# Altium schematic symbol library IC_TI.SCHLIB: 1162 symbols (part 3 of 8) (continued)
## LM5109BMA_NOPB
designator U?
Integrated Circuit; Manufacturer_Name: Texas Instruments; Manufacturer_Part_Number: LM5109BMA/NOPB; Datasheet Link: http://docs-emea.rs-online.com/webdocs/0b59/0900766b80b592e1.pdf; Height: 1.753mm; Mouser Part Number: 926-LM5109BMA/NOPB; Mouser Price/Stock: https://www.mouser.com/Search/Refine.aspx?Keyword=926-LM5109BMA%2FNOPB; RS Part Number: 0517270; RS Price/Stock: http://uk.rs-online.com/web/p/products/0517270
footprint SOIC8_1.27 (SOP, 8-Leads, Pitch 1.27mm)
pins: 1 VDD (power), 2 HI, 3 LI, 4 VSS (power), 5 LO, 6 HS, 7 HO, 8 HB

## LM7321MA
designator U?
Integrated Circuit; Manufacturer_Name: Texas Instruments; Manufacturer_Part_Number: LM7321MA; Datasheet Link: https://componentsearchengine.com/Datasheets/2/LM7321MA.pdf; Height: 1.75mm
footprint SOIC8_1.27 (SOP, 8-Leads, Pitch 1.27mm)
pins: 1 N/C_1, 2 -IN (in), 3 +IN (in), 4 V- (power), 5 N/C_2, 6 OUT (out), 7 V+, 8 N/C_3

## LM7321MF_NOPB
designator U?
Integrated Circuit; Manufacturer_Name: Texas Instruments; Manufacturer_Part_Number: LM7321MF/NOPB; Datasheet Link: http://www.ti.com/lit/gpn/lm7321; Height: 1.45mm; Mouser Part Number: 926-LM7321MF/NOPB; Mouser Price/Stock: https://www.mouser.com/Search/Refine.aspx?Keyword=926-LM7321MF%2FNOPB; RS Part Number: 1627716; RS Price/Stock: http://uk.rs-online.com/web/p/products/1627716
footprint SOT23-5 (SOT23, 5-Leads, Body 3.0x3.0mm (max), Pitch 0.95mm, IPC Medium Density)
pins: 1 OUT, 2 V-, 3 +IN, 4 -IN, 5 V+

## LM8261M5_NOPB
designator U?
Integrated Circuit; Manufacturer_Name: Texas Instruments; Manufacturer_Part_Number: LM8261M5/NOPB; Datasheet Link: http://www.ti.com/lit/ds/symlink/lm8261.pdf; Height: 1.45mm; Mouser Part Number: 926-LM8261M5/NOPB; Mouser Price/Stock: https://www.mouser.com/Search/Refine.aspx?Keyword=926-LM8261M5%2FNOPB; RS Part Number: 5343936P; RS Price/Stock: http://uk.rs-online.com/web/p/products/5343936P
footprint SOT23-5 (SOT23, 5-Leads, Body 3.0x3.0mm (max), Pitch 0.95mm, IPC Medium Density)
pins: 1 OUT (out), 2 V-, 3 +IN (in), 4 -IN (in), 5 V+

## LM22670MR-5.0_NOPB
designator U??
Undefined or Miscellaneous; Manufacturer_Name: Texas Instruments; Manufacturer_Part_Number: LM22670MR-5.0/NOPB; Datasheet Link: http://www.farnell.com/datasheets/2060263.pdf; Height: 1.68mm; Mouser Part Number: 926-LM22670MR50NOPB; Mouser Price/Stock: https://www.mouser.com/Search/Refine.aspx?Keyword=926-LM22670MR50NOPB; RS Part Number: 7614845P; RS Price/Stock: http://uk.rs-online.com/web/p/products/7614845P
footprint SOIC8_1.27-PAD
pins: 1 BOOT, 2 NC, 3 RT/SYNC, 4 FB, 5 EN, 6 GND, 7 VIN, 8 SW, 9 EP

## LM22676MR-5.0_NOPB
designator U?
Integrated Circuit; Manufacturer_Name: Texas Instruments; Manufacturer_Part_Number: LM22676MR-5.0/NOPB; Datasheet Link: http://www.ti.com/lit/gpn/lm22676; Height: 1.68mm; Mouser Part Number: 926-LM22676MR5.0NOPB; Mouser Price/Stock: https://www.mouser.com/Search/Refine.aspx?Keyword=926-LM22676MR5.0NOPB; RS Part Number: 7614870; RS Price/Stock: http://uk.rs-online.com/web/p/products/7614870
footprint SOIC8_1.27-PAD
pins: 1 BOOT, 2 NC_1, 3 NC_2, 4 FB, 5 EN, 6 GND, 7 VIN, 8 SW, 9 EP

## LM27313XMFX_NOPB
designator U?
Integrated Circuit; Manufacturer_Name: Texas Instruments; Manufacturer_Part_Number: LM27313XMFX/NOPB; Datasheet Link: http://www.ti.com/lit/ds/symlink/lm27313.pdf; Height: 1.45mm; Mouser Part Number: 926-LM27313XMFX/NOPB; Mouser Price/Stock: https://www.mouser.com/Search/Refine.aspx?Keyword=926-LM27313XMFX%2FNOPB
footprint SOT23-5 (SOT23, 5-Leads, Body 3.0x3.0mm (max), Pitch 0.95mm, IPC Medium Density)
pins: 1 SW, 2 GND, 3 FB, 4 ~{SHDN}, 5 VIN

## LM94022BIMG_NOPB
designator U?
Integrated Circuit; Manufacturer_Name: Texas Instruments; Manufacturer_Part_Number: LM94022BIMG/NOPB; Datasheet Link: http://www.ti.com/lit/ds/symlink/lm94022.pdf; Height: 1.1mm; Mouser Part Number: 926-LM94022BIMG/NOPB; Mouser Price/Stock: https://www.mouser.com/Search/Refine.aspx?Keyword=926-LM94022BIMG%2FNOPB; RS Part Number: 6394014P; RS Price/Stock: http://uk.rs-online.com/web/p/products/6394014P
footprint SOT353
pins: 1 GS0, 2 GND (power), 3 OUT (out), 4 VDD (power), 5 GS1

## LMC555CM_NOPB
designator U?
Integrated Circuit; Manufacturer_Name: Texas Instruments; Manufacturer_Part_Number: LMC555CM/NOPB; Datasheet Link: http://www.ti.com/lit/ds/symlink/lmc555.pdf; Height: 1.75mm; Mouser Part Number: 926-LMC555CM/NOPB; Mouser Price/Stock: https://www.mouser.com/Search/Refine.aspx?Keyword=926-LMC555CM%2FNOPB; RS Part Number: 5343992P; RS Price/Stock: http://uk.rs-online.com/web/p/products/5343992P
footprint SOIC8_1.27 (SOP, 8-Leads, Pitch 1.27mm)
pins: 1 GND (power), 2 ~{TRIGGER}, 3 OUTPUT (out), 4 ~{RESET}, 5 CONTROL_VOLTAGE, 6 THRESHOLD, 7 DISCHARGE, 8 V+

## LMC555CMM_NOPB
designator U?
Integrated Circuit; Manufacturer_Name: Texas Instruments; Manufacturer_Part_Number: LMC555CMM/NOPB; Datasheet Link: http://www.ti.com/lit/gpn/lmc555; Height: 1.1mm; Mouser Part Number: 926-LMC555CMM/NOPB; Mouser Price/Stock: https://www.mouser.com/Search/Refine.aspx?Keyword=926-LMC555CMM%2FNOPB; RS Part Number: 9222158; RS Price/Stock: http://uk.rs-online.com/web/p/products/9222158
footprint VSSOP8_0.65-PAD
pins: 1 GND, 2 ~{TRIGGER}, 3 OUTPUT, 4 ~{RESET}, 5 CONTROL_VOLTAGE, 6 THRESHOLD, 7 DISCHARGE, 8 V+

## LMC555CN_NOPB
designator U?
Integrated Circuit; Manufacturer_Name: Texas Instruments; Manufacturer_Part_Number: LMC555CN/NOPB; Datasheet Link: http://www.ti.com/lit/ml/mpdi001b/mpdi001b.pdf; Height: 5.08mm; Mouser Part Number: 926-LMC555CN/NOPB; Mouser Price/Stock: https://www.mouser.com/Search/Refine.aspx?Keyword=926-LMC555CN%2FNOPB; RS Part Number: 5344002P; RS Price/Stock: http://uk.rs-online.com/web/p/products/5344002P
footprint DIP8-A
pins: 1 GROUND, 2 ~{TRIGGER}, 3 OUTPUT (out), 4 ~{RESET}, 5 CONTROL_VOLTAGE, 6 THRESHOLD, 7 DISCHARGE, 8 V+

## LMC6482IM_NOPB
designator U?
Integrated Circuit; Manufacturer_Name: Texas Instruments; Manufacturer_Part_Number: LMC6482IM/NOPB; Datasheet Link: http://docs-emea.rs-online.com/webdocs/06f0/0900766b806f008d.pdf; Height: 1.75mm; Mouser Part Number: 926-LMC6482IM/NOPB; Mouser Price/Stock: https://www.mouser.com/Search/Refine.aspx?Keyword=926-LMC6482IM%2FNOPB; RS Part Number: 5360199P; RS Price/Stock: http://uk.rs-online.com/web/p/products/5360199P
footprint SOIC8_1.27 (SOP, 8-Leads, Pitch 1.27mm)
pins: 1 OUTPUT_A (out), 2 INPUTA- (in), 3 INPUTA+ (in), 4 V-, 5 INPUTB+ (in), 6 INPUTB- (in), 7 OUTPUT_B (out), 8 V+

## LMC6484AIM
designator U?
Integrated Circuit; Manufacturer_Name: Texas Instruments; Manufacturer_Part_Number: LMC6484AIM; Datasheet Link: http://www.ti.com/lit/ds/symlink/lmc6484.pdf; Height: 1.753mm; Mouser Part Number: 926-LMC6484AIM; Mouser Price/Stock: https://www.mouser.com/Search/Refine.aspx?Keyword=926-LMC6484AIM; RS Part Number: 4714949; RS Price/Stock: http://uk.rs-online.com/web/p/products/4714949
footprint SOIC14_1.27
pins: 1 1OUT (out), 2 1INPUT- (in), 3 1INPUT+ (in), 4 V+, 5 2INPUT+ (in), 6 2INPUT- (in), 7 2OUT (out), 8 3OUT (out), 9 3INPUT- (in), 10 3INPUT+ (in), 11 V-/GND (power), 12 4INPUT+ (in), 13 4INPUT- (in), 14 4OUT (out)

## LMC6484AIN
designator U?
Integrated Circuit; Manufacturer_Name: Texas Instruments; Manufacturer_Part_Number: LMC6484AIN; Mouser Part Number: 926-LMC6484AIN; Mouser Price/Stock: https://www.mouser.com/Search/Refine.aspx?Keyword=926-LMC6484AIN; RS Part Number: 4714955; RS Price/Stock: http://uk.rs-online.com/web/p/products/4714955
footprint DIP14
pins: 1 OUT_1, 2 NEG_1, 3 POS_1, 4 V+, 5 POS_2, 6 NEG_2, 7 OUT_2, 8 OUT_3, 9 NEG_3, 10 POS_3, 11 V-, 12 POS_4, 13 NEG_4, 14 OUT_4

## LMC7660IM_NOPB
designator U?
Integrated Circuit; Manufacturer_Name: Texas Instruments; Manufacturer_Part_Number: LMC7660IM/NOPB; Datasheet Link: http://www.ti.com/lit/ds/symlink/lmc7660.pdf; Height: 1.75mm; Mouser Part Number: 926-LMC7660IM/NOPB; Mouser Price/Stock: https://www.mouser.com/Search/Refine.aspx?Keyword=926-LMC7660IM%2FNOPB; RS Part Number: 5360212P; RS Price/Stock: http://uk.rs-online.com/web/p/products/5360212P
footprint SOIC8_1.27 (SOP, 8-Leads, Pitch 1.27mm)
pins: 1 NC, 2 CAP+, 3 GND (power), 4 CAP-, 5 VOUT (out), 6 LV, 7 OSC, 8 V+

## LMC7660IN_NOPB
designator U?
Integrated Circuit; Manufacturer_Name: Texas Instruments; Manufacturer_Part_Number: LMC7660IN/NOPB; Datasheet Link: http://www.ti.com/lit/gpn/lmc7660; Height: 5.08mm; Mouser Part Number: 926-LMC7660IN/NOPB; Mouser Price/Stock: https://www.mouser.com/Search/Refine.aspx?Keyword=926-LMC7660IN%2FNOPB; RS Part Number: 0460544P; RS Price/Stock: http://uk.rs-online.com/web/p/products/0460544P
footprint DIP8-A
pins: 1 N/C, 2 CAP+, 3 GND, 4 CAP-, 5 VOUT, 6 LV, 7 OSC, 8 V+

## LME49720MA
designator U?
Integrated Circuit; Manufacturer_Name: Texas Instruments; Manufacturer_Part_Number: LME49720MA; Datasheet Link: http://www.ti.com/lit/ds/symlink/lme49720.pdf; Height: 1.75mm
footprint SOIC8_1.27 (SOP, 8-Leads, Pitch 1.27mm)
pins: 1 OUTPUT_A (out), 2 INVERTING_INPUT_A (in), 3 NON-INVERTING_INPUT_A (in), 4 V-, 5 NON-INVERTING_INPUT_B (in), 6 INVERTING_INPUT_B (in), 7 OUTPUT_B (out), 8 V+

## LME49720NA_NOPB
designator U?
Integrated Circuit; Manufacturer_Name: Texas Instruments; Manufacturer_Part_Number: LME49720NA/NOPB; Datasheet Link: http://www.ti.com/lit/ds/symlink/lme49720.pdf; Height: 5.08mm; Mouser Part Number: 926-LME49720NA/NOPB; Mouser Price/Stock: https://www.mouser.com/Search/Refine.aspx?Keyword=926-LME49720NA%2FNOPB; RS Part Number: 7616217P; RS Price/Stock: http://uk.rs-online.com/web/p/products/7616217P
footprint DIP8-A
pins: 1 OUTPUT_A, 2 INPUTA_-, 3 INPUTA_+, 4 V-, 5 INPUT_B+, 6 INPUT_B-, 7 OUTPUT_B, 8 V+

## LMR14020SDDA
designator U?
Integrated Circuit; Manufacturer_Name: Texas Instruments; Manufacturer_Part_Number: LMR14020SDDA; Datasheet Link: http://www.ti.com/lit/ds/symlink/lmr14020.pdf; Height: 1.7mm; Mouser Part Number: 595-LMR14020SDDA; Mouser Price/Stock: https://www.mouser.com/Search/Refine.aspx?Keyword=595-LMR14020SDDA; RS Part Number: 1629813; RS Price/Stock: http://uk.rs-online.com/web/p/products/1629813
footprint SOIC8_1.27-PAD
pins: 1 BOOT, 2 VIN (in), 3 EN, 4 RT/SYNC, 5 FB, 6 SS, 7 GND (power), 8 SW, 9 EP (power)

## LMR14020SDDAR
designator U?
Integrated Circuit; Manufacturer_Name: Texas Instruments; Manufacturer_Part_Number: LMR14020SDDAR; Datasheet Link: http://www.ti.com/lit/gpn/lmr14020; Height: 1.7mm; Mouser Part Number: 595-LMR14020SDDAR; Mouser Price/Stock: https://www.mouser.com/Search/Refine.aspx?Keyword=595-LMR14020SDDAR
footprint SOIC8_1.27 (SOP, 8-Leads, Pitch 1.27mm)
pins: 1 BOOT, 2 VIN, 3 EN, 4 RT/SYNC, 5 FB, 6 SS, 7 GND, 8 SW

## LMR14030SDDA
designator U?
Integrated Circuit; Manufacturer_Name: Texas Instruments; Manufacturer_Part_Number: LMR14030SDDA; Datasheet Link: http://www.ti.com/lit/ds/symlink/lmr14030.pdf; Height: 1.7mm; Mouser Part Number: 595-LMR14030SDDA; Mouser Price/Stock: https://www.mouser.com/Search/Refine.aspx?Keyword=595-LMR14030SDDA; RS Part Number: 1456281; RS Price/Stock: http://uk.rs-online.com/web/p/products/1456281
footprint SOIC8_1.27-PAD
pins: 1 BOOT, 2 VIN (in), 3 EN, 4 RT/SYNC, 5 FB, 6 SS, 7 GND (power), 8 SW, 9 EP

## LMR16010PDDAR
designator U?
Integrated Circuit; Manufacturer_Name: Texas Instruments; Manufacturer_Part_Number: LMR16010PDDAR; Datasheet Link: http://www.ti.com/lit/ds/symlink/lmr16010.pdf; Height: 1.7mm; Mouser Part Number: 595-LMR16010PDDAR; Mouser Price/Stock: https://www.mouser.com/Search/Refine.aspx?Keyword=595-LMR16010PDDAR
footprint SOIC8_1.27-PAD
pins: 1 BOOT, 2 VIN, 3 EN, 4 RT/SYNC, 5 FB, 6 PGOOD, 7 GND, 8 SW, 9 EP

## LMR16020PDDAR
designator U?
Integrated Circuit; Manufacturer_Name: Texas Instruments; Manufacturer_Part_Number: LMR16020PDDAR; Datasheet Link: http://www.ti.com/lit/gpn/lmr16020; Height: 1.7mm; Mouser Part Number: 595-LMR16020PDDAR; Mouser Price/Stock: https://www.mouser.com/Search/Refine.aspx?Keyword=595-LMR16020PDDAR
footprint SOIC8_1.27-PAD
pins: 1 BOOT, 2 VIN, 3 EN, 4 RT/SYNC, 5 FB, 6 PGOOD, 7 GND, 8 SW, 9 EP

## LMR16030SDDAR
designator U?
Integrated Circuit; Manufacturer_Name: Texas Instruments; Manufacturer_Part_Number: LMR16030SDDAR; Datasheet Link: http://www.ti.com/lit/gpn/lmr16030; Height: 1.7mm; Mouser Part Number: 595-LMR16030SDDAR; Mouser Price/Stock: https://www.mouser.com/Search/Refine.aspx?Keyword=595-LMR16030SDDAR
footprint SOIC8_1.27-PAD
pins: 1 BOOT, 2 VIN, 3 EN, 4 RT/SYNC, 5 FB, 6 SS, 7 GND, 8 SW, 9 EP

## LMV321IDBVR
designator U?
Integrated Circuit; Manufacturer_Name: Texas Instruments; Manufacturer_Part_Number: LMV321IDBVR; Datasheet Link: http://www.ti.com/lit/gpn/lmv321; Mouser Part Number: 595-LMV321IDBVR; Mouser Price/Stock: https://www.mouser.com/Search/Refine.aspx?Keyword=595-LMV321IDBVR
footprint SOT23-5 (SOT23, 5-Leads, Body 3.0x3.0mm (max), Pitch 0.95mm, IPC Medium Density)
pins: 1 1IN+, 2 GND, 3 1IN-, 4 OUT, 5 VCC+

## LMV321M5_NOPB
designator U?
Integrated Circuit; Manufacturer_Name: Texas Instruments; Manufacturer_Part_Number: LMV321M5/NOPB; Datasheet Link: http://www.ti.com/lit/ds/symlink/lmv321-n.pdf; Height: 1.45mm; Mouser Part Number: 926-LMV321M5/NOPB; Mouser Price/Stock: https://www.mouser.com/Search/Refine.aspx?Keyword=926-LMV321M5%2FNOPB; RS Part Number: 5338366P; RS Price/Stock: http://uk.rs-online.com/web/p/products/5338366P
footprint SOT23-5 (SOT23, 5-Leads, Body 3.0x3.0mm (max), Pitch 0.95mm, IPC Medium Density)
pins: 1 +IN (in), 2 V-, 3 -IN (in), 4 OUTPUT (out), 5 V+

## LMV324DTBR2G
designator U?
Integrated Circuit; Manufacturer_Name: ON Semiconductor; Manufacturer_Part_Number: LMV324DTBR2G; Datasheet Link: https://www.onsemi.com/pub/Collateral/LMV321-LMV358-LMV324-D.PDF; Height: 1.2mm; Mouser Part Number: 863-LMV324DTBR2G; Mouser Price/Stock: https://www.mouser.com/Search/Refine.aspx?Keyword=863-LMV324DTBR2G; RS Part Number: 1629358; RS Price/Stock: http://uk.rs-online.com/web/p/products/1629358
footprint TSSOP14_0.65 (TSOP, 14-Leads, Body 5.00x4.40mm, Pitch 0.65mm, Thermal Pad 2.31x2.46mm, IPC Low Density)
pins: 1 OUTA (out), 2 INA- (in), 3 INA+ (in), 4 VCC (power), 5 INB+ (in), 6 INB- (in), 7 OUTB (out), 8 OUTC (out), 9 INC- (in), 10 INC+ (in), 11 VEE (power), 12 IND+ (in), 13 IND- (in), 14 OUTD (out)

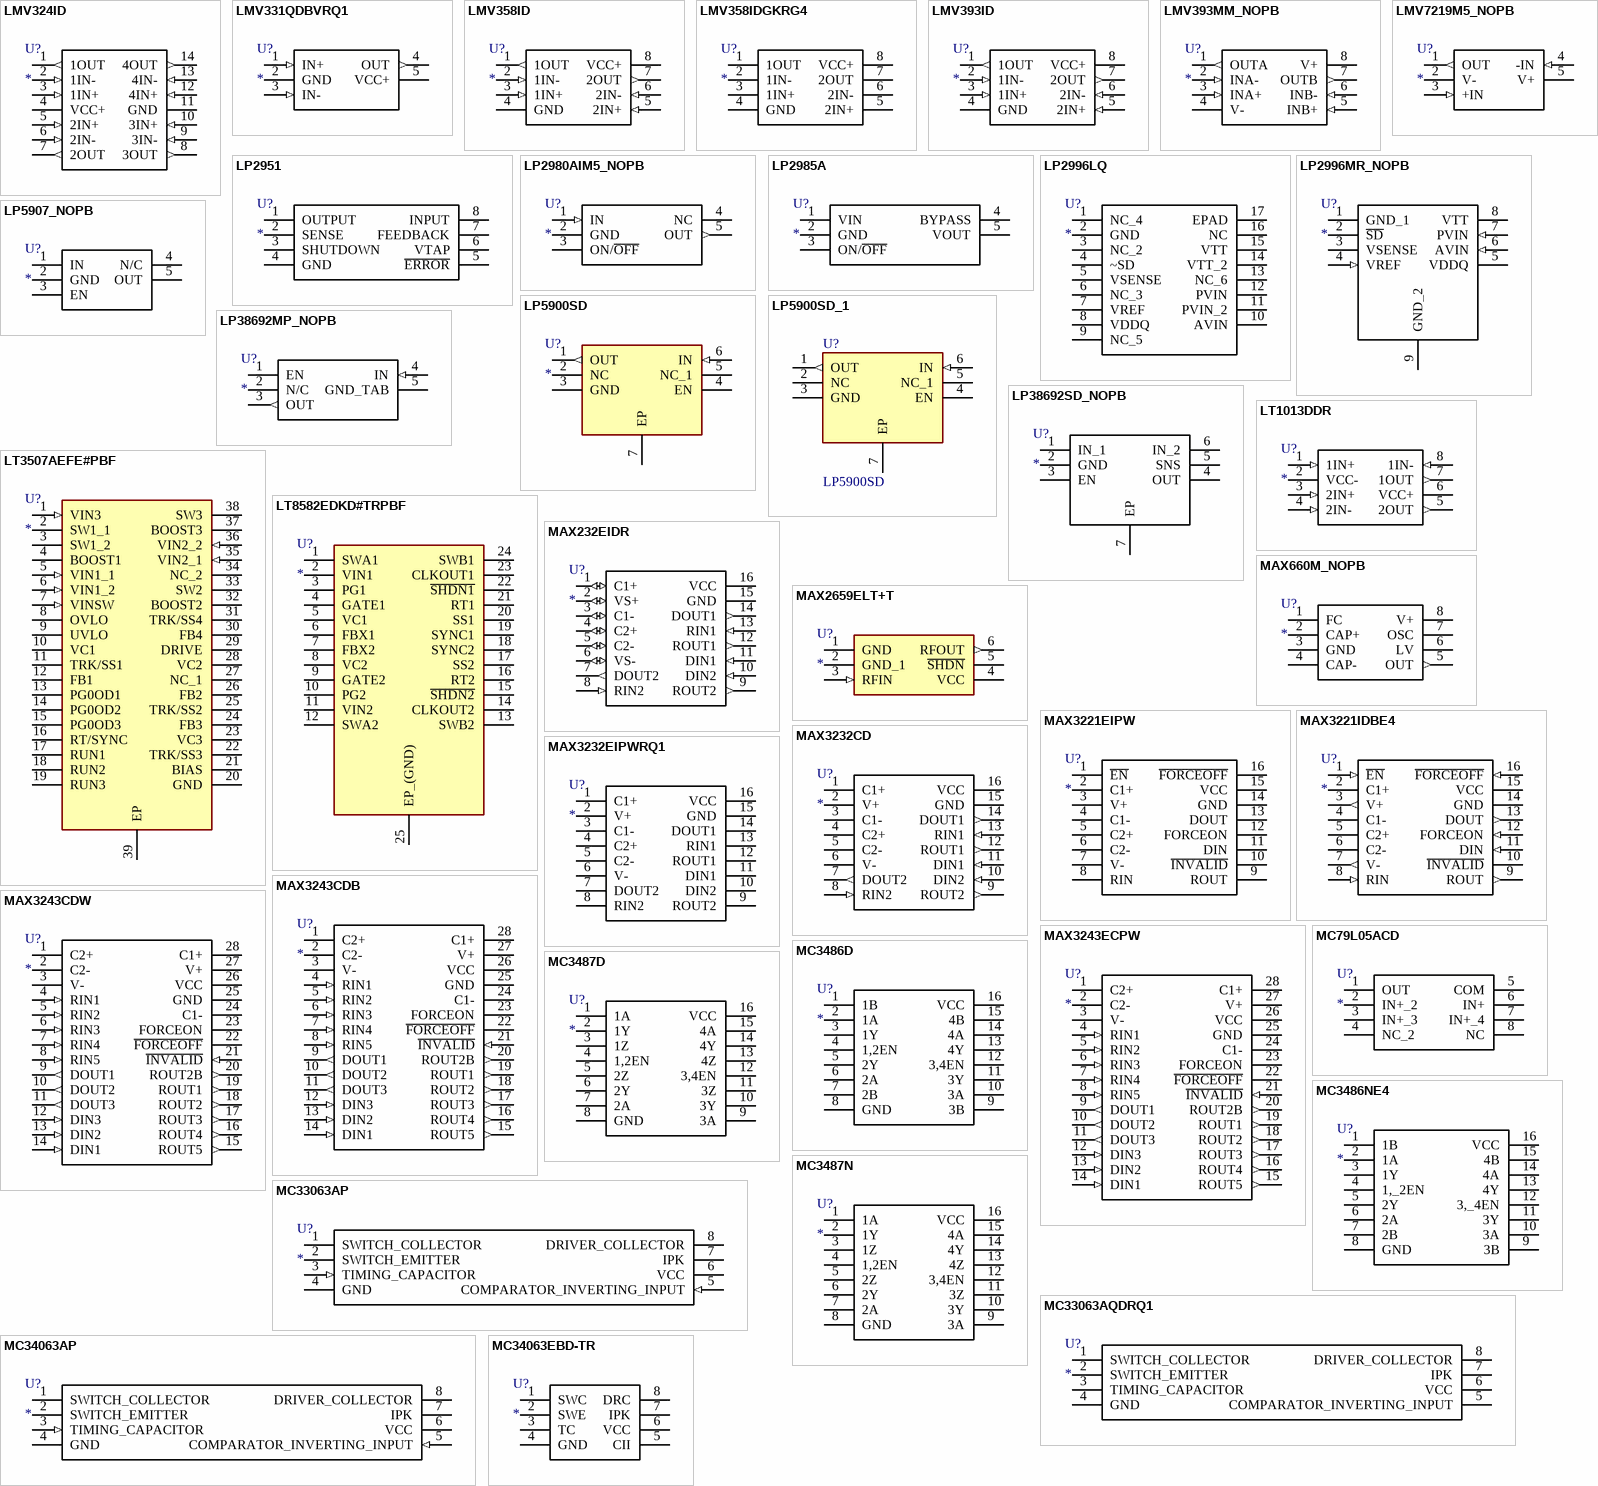
[diagram p11: symbols LMV324ID to MC34063EBD-TR]

## LMV324ID
designator U?
Integrated Circuit; Manufacturer_Name: Texas Instruments; Manufacturer_Part_Number: LMV324ID; Datasheet Link: http://www.ti.com/lit/ds/symlink/lmv324.pdf; Height: 1.75mm; Mouser Part Number: 595-LMV324ID; Mouser Price/Stock: https://www.mouser.com/Search/Refine.aspx?Keyword=595-LMV324ID; RS Part Number: 1450106; RS Price/Stock: http://uk.rs-online.com/web/p/products/1450106
footprint SOIC14_1.27
pins: 1 1OUT (out), 2 1IN- (in), 3 1IN+ (in), 4 VCC+ (power), 5 2IN+ (in), 6 2IN- (in), 7 2OUT (out), 8 3OUT (out), 9 3IN- (in), 10 3IN+ (in), 11 GND (power), 12 4IN+ (in), 13 4IN- (in), 14 4OUT (out)

## LMV331QDBVRQ1
designator U?
Integrated Circuit; Manufacturer_Name: Texas Instruments; Manufacturer_Part_Number: LMV331QDBVRQ1; Datasheet Link: http://www.ti.com/lit/ds/symlink/lmv331-q1.pdf; Height: 1.45mm; Mouser Part Number: 595-LMV331QDBVRQ1; Mouser Price/Stock: https://www.mouser.com/Search/Refine.aspx?Keyword=595-LMV331QDBVRQ1; RS Part Number: 7321089P; RS Price/Stock: http://uk.rs-online.com/web/p/products/7321089P
footprint SOT23-5 (SOT23, 5-Leads, Body 3.0x3.0mm (max), Pitch 0.95mm, IPC Medium Density)
pins: 1 IN+ (in), 2 GND (power), 3 IN- (in), 4 OUT (out), 5 VCC+ (power)

## LMV358ID
designator U?
Integrated Circuit; Manufacturer_Name: Texas Instruments; Manufacturer_Part_Number: LMV358ID; Datasheet Link: http://www.ti.com/lit/ds/symlink/lmv358.pdf; Height: 1.75mm; Mouser Part Number: 595-LMV358ID; Mouser Price/Stock: https://www.mouser.com/Search/Refine.aspx?Keyword=595-LMV358ID; RS Part Number: 6610559; RS Price/Stock: http://uk.rs-online.com/web/p/products/6610559
footprint SOIC8_1.27 (SOP, 8-Leads, Pitch 1.27mm)
pins: 1 1OUT (out), 2 1IN- (in), 3 1IN+ (in), 4 GND (power), 5 2IN+ (in), 6 2IN- (in), 7 2OUT (out), 8 VCC+ (power)

## LMV358IDGKRG4
designator U?
Integrated Circuit; Manufacturer_Name: Texas Instruments; Manufacturer_Part_Number: LMV358IDGKRG4; Datasheet Link: http://www.ti.com/lit/ds/symlink/lmv358.pdf; Height: 1.1mm; Mouser Part Number: 595-LMV358IDGKRG4; Mouser Price/Stock: https://www.mouser.com/Search/Refine.aspx?Keyword=595-LMV358IDGKRG4
footprint VSSOP8_0.65
pins: 1 1OUT, 2 1IN-, 3 1IN+, 4 GND, 5 2IN+, 6 2IN-, 7 2OUT, 8 VCC+

## LMV393ID
designator U?
Integrated Circuit; Manufacturer_Name: Texas Instruments; Manufacturer_Part_Number: LMV393ID; Datasheet Link: http://www.ti.com/lit/ds/symlink/lmv339.pdf; Height: 1.75mm; Mouser Part Number: 595-LMV393ID; Mouser Price/Stock: https://www.mouser.com/Search/Refine.aspx?Keyword=595-LMV393ID; RS Part Number: 1624788; RS Price/Stock: http://uk.rs-online.com/web/p/products/1624788
footprint SOIC8_1.27 (SOP, 8-Leads, Pitch 1.27mm)
pins: 1 1OUT (out), 2 1IN- (in), 3 1IN+ (in), 4 GND (power), 5 2IN+ (in), 6 2IN- (in), 7 2OUT (out), 8 VCC+ (power)

## LMV393MM_NOPB
designator U?
Integrated Circuit; Manufacturer_Name: Texas Instruments; Manufacturer_Part_Number: LMV393MM/NOPB; Datasheet Link: http://www.ti.com/lit/ds/symlink/lmv393-n.pdf; Height: 1.1mm; Mouser Part Number: 926-LMV393MM/NOPB; Mouser Price/Stock: https://www.mouser.com/Search/Refine.aspx?Keyword=926-LMV393MM%2FNOPB; RS Part Number: 1624789; RS Price/Stock: http://uk.rs-online.com/web/p/products/1624789
footprint VSSOP8_0.65-PAD
pins: 1 OUTA (out), 2 INA- (in), 3 INA+ (in), 4 V-, 5 INB+ (in), 6 INB- (in), 7 OUTB (out), 8 V+

## LMV7219M5_NOPB
designator U?
Integrated Circuit; Manufacturer_Name: Texas Instruments; Manufacturer_Part_Number: LMV7219M5/NOPB; Datasheet Link: http://www.ti.com/lit/ds/symlink/lmv7219.pdf; Height: 1.45mm; Mouser Part Number: 926-LMV7219M5/NOPB; Mouser Price/Stock: https://www.mouser.com/Search/Refine.aspx?Keyword=926-LMV7219M5%2FNOPB; RS Part Number: 5344765P; RS Price/Stock: http://uk.rs-online.com/web/p/products/5344765P
footprint SOT23-5 (SOT23, 5-Leads, Body 3.0x3.0mm (max), Pitch 0.95mm, IPC Medium Density)
pins: 1 OUT (out), 2 V-, 3 +IN (in), 4 -IN (in), 5 V+

## LP2951
designator U?
Integrated Circuit; Manufacturer_Name: Texas Instruments; Manufacturer_Part_Number: LP2951-33D; Datasheet Link: http://www.ti.com/lit/ds/symlink/lp2951-33.pdf; Height: 1.75mm; Mouser Part Number: 595-LP2951-33D; Mouser Price/Stock: https://www.mouser.com/Search/Refine.aspx?Keyword=595-LP2951-33D; RS Part Number: 1456058; RS Price/Stock: http://uk.rs-online.com/web/p/products/1456058
footprint SOIC8_1.27 (SOP, 8-Leads, Pitch 1.27mm)
pins: 1 OUTPUT, 2 SENSE, 3 SHUTDOWN, 4 GND, 5 ~{ERROR}, 6 VTAP, 7 FEEDBACK, 8 INPUT

## LP2980AIM5_NOPB
designator U?
Integrated Circuit; Manufacturer_Name: Texas Instruments; Manufacturer_Part_Number: LP2980AIM5-2.5/NOPB; Datasheet Link: http://www.ti.com/lit/ds/symlink/lp2980-n.pdf; Height: 1.45mm; Mouser Part Number: 926-LP2980AIM525NOPB; Mouser Price/Stock: https://www.mouser.com/Search/Refine.aspx?Keyword=926-LP2980AIM525NOPB; RS Part Number: 1624797; RS Price/Stock: http://uk.rs-online.com/web/p/products/1624797
footprint SOT23-5 (SOT23, 5-Leads, Body 3.0x3.0mm (max), Pitch 0.95mm, IPC Medium Density)
pins: 1 IN (in), 2 GND (power), 3 ON/~{OFF}, 4 NC, 5 OUT (out)

## LP2985A
designator U?
Integrated Circuit; Manufacturer_Name: Texas Instruments; Manufacturer_Part_Number: LP2985A-25DBVT; Datasheet Link: http://www.ti.com/lit/ds/symlink/lp2985a.pdf; Height: 1.45mm; Mouser Part Number: 595-LP2985A-25DBVT; Mouser Price/Stock: https://www.mouser.com/Search/Refine.aspx?Keyword=595-LP2985A-25DBVT; RS Part Number: 1625841; RS Price/Stock: http://uk.rs-online.com/web/p/products/1625841
footprint SOT23-5 (SOT23, 5-Leads, Body 3.0x3.0mm (max), Pitch 0.95mm, IPC Medium Density)
pins: 1 VIN, 2 GND, 3 ON/~{OFF}, 4 BYPASS, 5 VOUT

## LP2996LQ
designator U?
Integrated Circuit; Manufacturer_Name: Texas Instruments; Manufacturer_Part_Number: LP2996LQ
footprint QFN16_0.5-PAD(4x4)
pins: 1 NC_4, 2 GND, 3 NC_2, 4 ~SD, 5 VSENSE, 6 NC_3, 7 VREF, 8 VDDQ, 9 NC_5, 10 AVIN, 11 PVIN_2, 12 PVIN, 13 NC_6, 14 VTT_2, 15 VTT, 16 NC, 17 EPAD

## LP2996MR_NOPB
designator U?
Integrated Circuit; Manufacturer_Name: Texas Instruments; Manufacturer_Part_Number: LP2996MR/NOPB; Datasheet Link: http://www.ti.com/lit/ds/symlink/lp2996-n.pdf; Height: 1.7mm; Mouser Part Number: 926-LP2996MR/NOPB; Mouser Price/Stock: https://www.mouser.com/Search/Refine.aspx?Keyword=926-LP2996MR%2FNOPB; RS Part Number: 5360773P; RS Price/Stock: http://uk.rs-online.com/web/p/products/5360773P
footprint SOIC8_1.27-PAD
pins: 1 GND_1 (power), 2 ~{SD}, 3 VSENSE, 4 VREF (in), 5 VDDQ (power), 6 AVIN (in), 7 PVIN (in), 8 VTT, 9 GND_2 (power)

## LP5900SD
designator U?
Integrated Circuit; Manufacturer_Name: Texas Instruments; Manufacturer_Part_Number: LP5900SD-1.5; Datasheet Link: http://www.ti.com/lit/ds/symlink/lp5900.pdf; Height: 0.8mm; RS Part Number: 6515081
footprint DFN6_0.65-PAD(2.2X2.5)
pins: 1 OUT (out), 2 NC, 3 GND (power), 4 EN, 5 NC_1, 6 IN (in), 7 EP (power)

## LP5900SD_1
designator U?, comment LP5900SD
Integrated Circuit; Manufacturer_Name: Texas Instruments; Manufacturer_Part_Number: LP5900SD-1.5; Datasheet Link: http://www.ti.com/lit/ds/symlink/lp5900.pdf; Height: 0.8mm; RS Part Number: 6515081
footprint DFN6_0.65-PAD(2.2X2.5)
pins: 1 OUT (out), 2 NC, 3 GND (power), 4 EN, 5 NC_1, 6 IN (in), 7 EP (power)

## LP5907_NOPB
designator U?
Integrated Circuit; Manufacturer_Name: Texas Instruments; Manufacturer_Part_Number: LP5907MFX-3.3/NOPB; Datasheet Link: http://www.farnell.com/datasheets/1950580.pdf; Height: 1.45mm; Mouser Part Number: 595-LP5907MFX-3.3NPB; Mouser Price/Stock: https://www.mouser.com/Search/Refine.aspx?Keyword=595-LP5907MFX-3.3NPB
footprint SOT23-5 (SOT23, 5-Leads, Body 3.0x3.0mm (max), Pitch 0.95mm, IPC Medium Density)
pins: 1 IN, 2 GND, 3 EN, 4 N/C, 5 OUT

## LP38692MP_NOPB
designator U?
Integrated Circuit; Manufacturer_Name: Texas Instruments; Manufacturer_Part_Number: LP38692MP-1.8/NOPB; Datasheet Link: http://www.ti.com/lit/ds/symlink/lp38692.pdf; Height: 1.8mm; Mouser Part Number: 926-LP38692MP18NOPB; Mouser Price/Stock: https://www.mouser.com/Search/Refine.aspx?Keyword=926-LP38692MP18NOPB; RS Part Number: 5379137P; RS Price/Stock: http://uk.rs-online.com/web/p/products/5379137P
footprint SOT223-5
pins: 1 EN, 2 N/C, 3 OUT (out), 4 IN (in), 5 GND_TAB (power)

## LP38692SD_NOPB
designator U?
Integrated Circuit; Manufacturer_Name: Texas Instruments; Manufacturer_Part_Number: LP38692SD-3.3/NOPB; Datasheet Link: http://www.ti.com/lit/ds/symlink/lp38690.pdf; Height: 0.8mm; Mouser Part Number: 926-LP38692SD33NOPB; Mouser Price/Stock: https://www.mouser.com/Search/Refine.aspx?Keyword=926-LP38692SD33NOPB; RS Part Number: 1626339; RS Price/Stock: http://uk.rs-online.com/web/p/products/1626339
footprint DFN6_0.95-PAD(3X3)
pins: 1 IN_1, 2 GND, 3 EN, 4 OUT, 5 SNS, 6 IN_2, 7 EP

## LT1013DDR
designator U?
Integrated Circuit; Manufacturer_Name: Texas Instruments; Manufacturer_Part_Number: LT1013DDR; Datasheet Link: http://www.ti.com/lit/ds/symlink/lt1013d.pdf; Height: 1.75mm; Mouser Part Number: 595-LT1013DDR; Mouser Price/Stock: https://www.mouser.com/Search/Refine.aspx?Keyword=595-LT1013DDR; RS Part Number: 6609681; RS Price/Stock: http://uk.rs-online.com/web/p/products/6609681
footprint SOIC8_1.27 (SOP, 8-Leads, Pitch 1.27mm)
pins: 1 1IN+ (in), 2 VCC- (power), 3 2IN+ (in), 4 2IN- (in), 5 2OUT (out), 6 VCC+ (power), 7 1OUT (out), 8 1IN- (in)